# Altium schematic symbol library IC_ADI.SCHLIB: 3169 symbols (part 132 of 181)
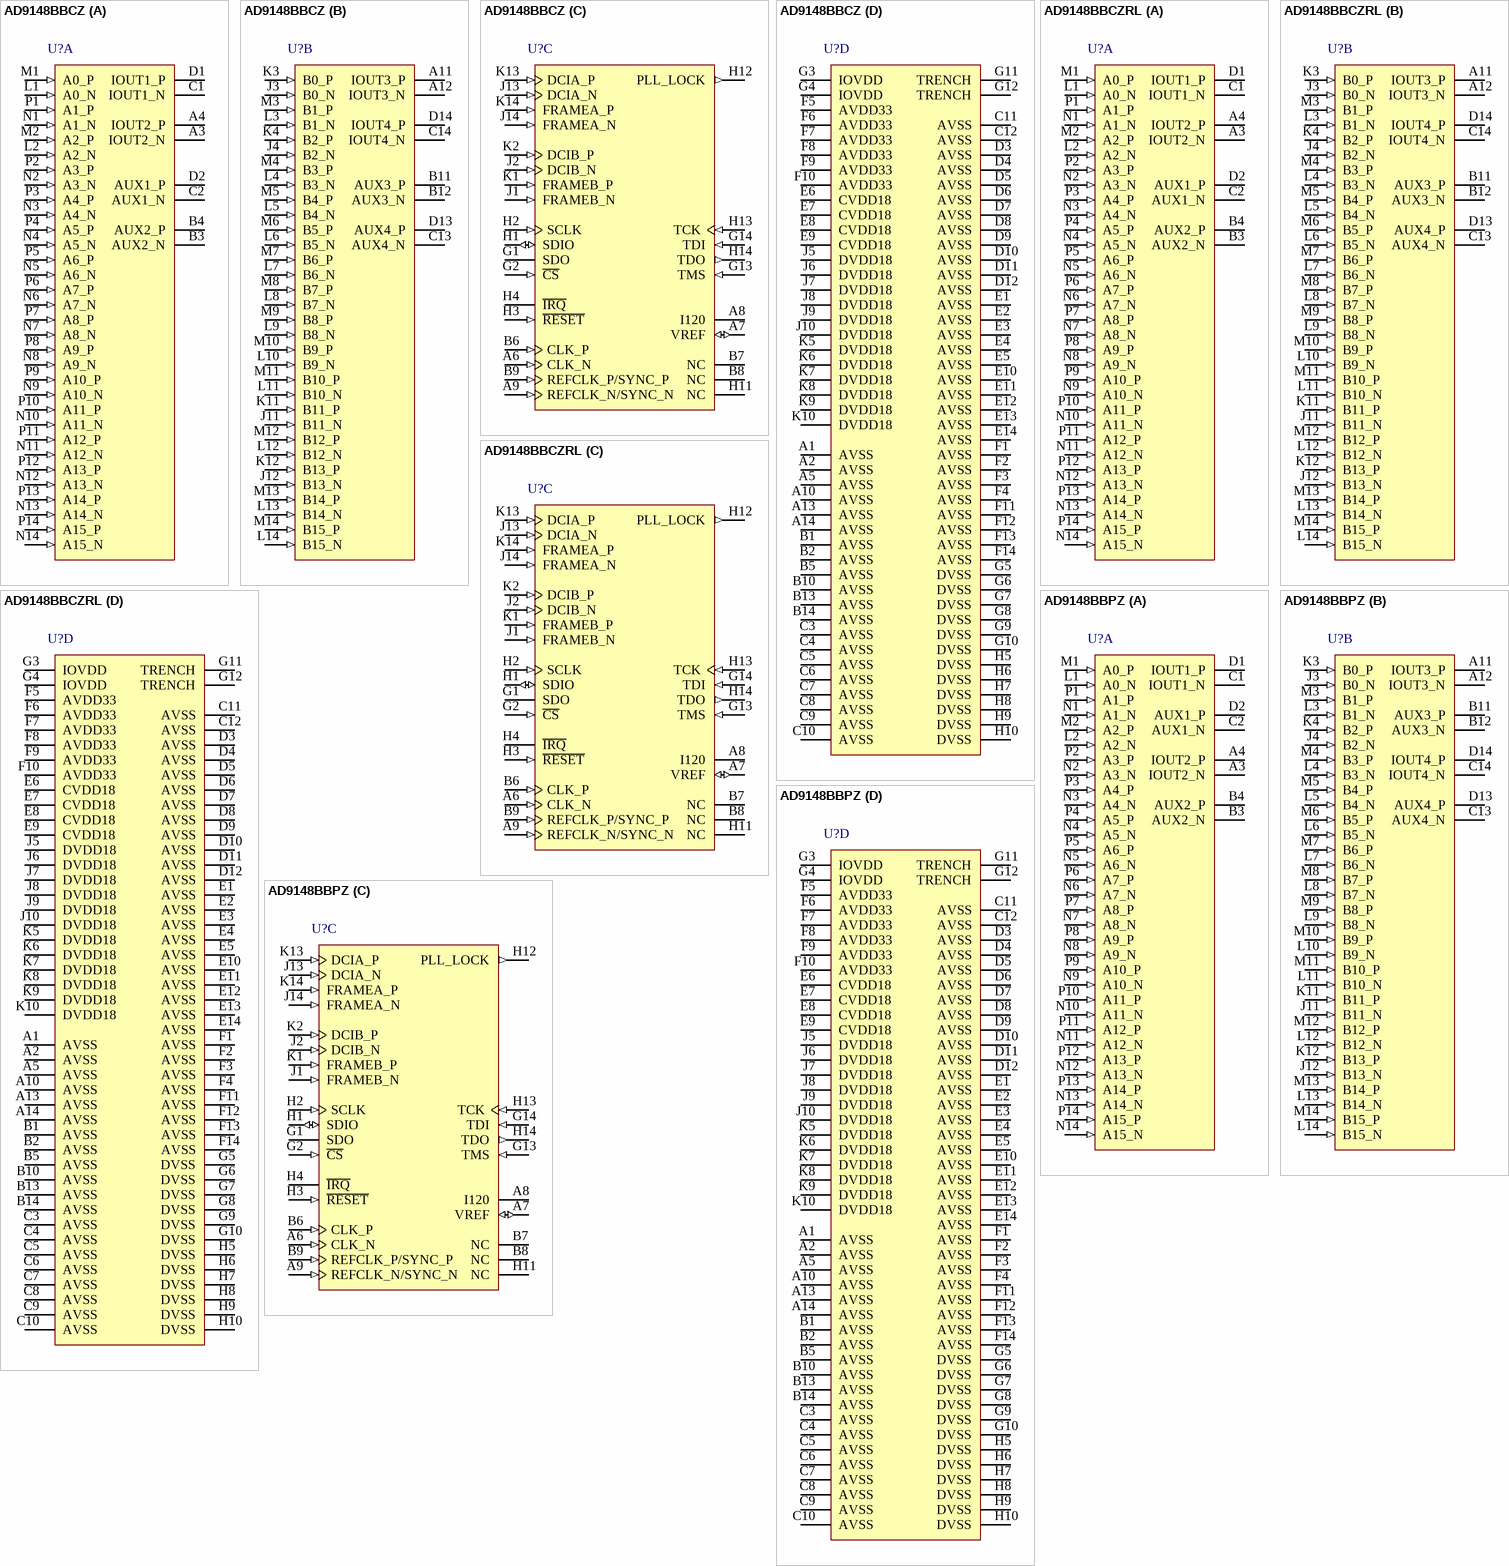
[diagram p322: symbols AD9148BBCZ to AD9148BBPZ]

## AD9148BBPZ
designator U?
Quad 16-Bit 1 Gsps TxDAC+ Digital-to-Analog Converter, -40 to +85 degC, BP-196-1, Pb-Free, Tray; Generic Part Number: AD9148; PartNumber: AD9148BBPZ; # DAC Outputs: 4; Max V+: 3.47V; Op Pwr Diss: 3W; Resolution (Bits): 16; Single Supply: No; DatasheetVersion: Rev.B; PackageVersion: 02-07-2012A; PackageReference: BP-196-1; PackageDescription: 196-Ball Ball Grid Array, Thermally Enhanced [BGA_ED]; Supplier Part Number 1: AD9148BBPZ-ND; Supplier Part Number 2: 83R9368; Supplier Part Number 3: 584-AD9148BBPZ; Packing: Tray; RoHS: Y; Mounting Technology: Surface Mount; Code_JEDEC: MO-192; ComponentLink1Description: Manufacturer URL; ComponentLink2Description: Datasheet; ComponentLink3Description: Product URL
footprint BGA196_0.8(12X12) (Footprint not found)
part A pins: A3 IOUT2_N (hiz) "DAC 2 Complementary Output Current.", A4 IOUT2_P (hiz) "DAC 2 Positive Output Current.", B3 AUX2_N (hiz) "Auxiliary DAC 2 Complementary Output Current.", B4 AUX2_P (hiz) "Auxiliary DAC 2 Positive Output Current.", C1 IOUT1_N (hiz) "DAC 1 Complementary Output Current.", C2 AUX1_N (hiz) "Auxiliary DAC 1 Complementary Output Current.", D1 IOUT1_P (hiz) "DAC 1 Positive Output Current.", D2 AUX1_P (hiz) "Auxiliary DAC 1 Positive Output Current.", L1 A0_N (in) "LVDS Data Input Pair, Port A (LSB).", L2 A2_N (in) "LVDS Data Input Pair, Port A.", M1 A0_P (in) "LVDS Data Input Pair, Port A (LSB).", M2 A2_P (in) "LVDS Data Input Pair, Port A.", N1 A1_N (in) "LVDS Data Input Pair, Port A.", N2 A3_N (in) "LVDS Data Input Pair, Port A.", N3 A4_N (in) "LVDS Data Input Pair, Port A.", N4 A5_N (in) "LVDS Data Input Pair, Port A.", N5 A6_N (in) "LVDS Data Input Pair, Port A.", N6 A7_N (in) "LVDS Data Input Pair, Port A.", N7 A8_N (in) "LVDS Data Input Pair, Port A.", N8 A9_N (in) "LVDS Data Input Pair, Port A.", N9 A10_N (in) "LVDS Data Input Pair, Port A.", N10 A11_N (in) "LVDS Data Input Pair, Port A.", N11 A12_N (in) "LVDS Data Input Pair, Port A.", N12 A13_N (in) "LVDS Data Input Pair, Port A.", N13 A14_N (in) "LVDS Data Input Pair, Port A.", N14 A15_N (in) "LVDS Data Input Pair, Port A (MSB).", P1 A1_P (in) "LVDS Data Input Pair, Port A.", P2 A3_P (in) "LVDS Data Input Pair, Port A.", P3 A4_P (in) "LVDS Data Input Pair, Port A.", P4 A5_P (in) "LVDS Data Input Pair, Port A.", P5 A6_P (in) "LVDS Data Input Pair, Port A.", P6 A7_P (in) "LVDS Data Input Pair, Port A.", P7 A8_P (in) "LVDS Data Input Pair, Port A.", P8 A9_P (in) "LVDS Data Input Pair, Port A.", P9 A10_P (in) "LVDS Data Input Pair, Port A.", P10 A11_P (in) "LVDS Data Input Pair, Port A.", P11 A12_P (in) "LVDS Data Input Pair, Port A.", P12 A13_P (in) "LVDS Data Input Pair, Port A.", P13 A14_P (in) "LVDS Data Input Pair, Port A.", P14 A15_P (in) "LVDS Data Input Pair, Port A (MSB)."
part B pins: A11 IOUT3_P (hiz) "DAC 3 Positive Output Current.", A12 IOUT3_N (hiz) "DAC 3 Complementary Output Current.", B11 AUX3_P (hiz) "Auxiliary DAC 3 Positive Output Current.", B12 AUX3_N (hiz) "Auxiliary DAC 3 Complementary Output Current.", C13 AUX4_N (hiz) "Auxiliary DAC 4 Complementary Output Current.", C14 IOUT4_N (hiz) "DAC 4 Complementary Output Current.", D13 AUX4_P (hiz) "Auxiliary DAC 4 Positive Output Current.", D14 IOUT4_P (hiz) "DAC 4 Positive Output Current.", J3 B0_N (in) "LVDS Data Input Pair, Port B (LSB).", J4 B2_N (in) "LVDS Data Input Pair, Port B.", J11 B11_N (in) "LVDS Data Input Pair, Port B.", J12 B13_N (in) "LVDS Data Input Pair, Port B.", K3 B0_P (in) "LVDS Data Input Pair, Port B (LSB).", K4 B2_P (in) "LVDS Data Input Pair, Port B.", K11 B11_P (in) "LVDS Data Input Pair, Port B.", K12 B13_P (in) "LVDS Data Input Pair, Port B.", L3 B1_N (in) "LVDS Data Input Pair, Port B.", L4 B3_N (in) "LVDS Data Input Pair, Port B.", L5 B4_N (in) "LVDS Data Input Pair, Port B.", L6 B5_N (in) "LVDS Data Input Pair, Port B.", L7 B6_N (in) "LVDS Data Input Pair, Port B.", L8 B7_N (in) "LVDS Data Input Pair, Port B.", L9 B8_N (in) "LVDS Data Input Pair, Port B.", L10 B9_N (in) "LVDS Data Input Pair, Port B.", L11 B10_N (in) "LVDS Data Input Pair, Port B.", L12 B12_N (in) "LVDS Data Input Pair, Port B.", L13 B14_N (in) "LVDS Data Input Pair, Port B.", L14 B15_N (in) "LVDS Data Input Pair, Port B (MSB).", M3 B1_P (in) "LVDS Data Input Pair, Port B.", M4 B3_P (in) "LVDS Data Input Pair, Port B.", M5 B4_P (in) "LVDS Data Input Pair, Port B.", M6 B5_P (in) "LVDS Data Input Pair, Port B.", M7 B6_P (in) "LVDS Data Input Pair, Port B.", M8 B7_P (in) "LVDS Data Input Pair, Port B.", M9 B8_P (in) "LVDS Data Input Pair, Port B.", M10 B9_P (in) "LVDS Data Input Pair, Port B.", M11 B10_P (in) "LVDS Data Input Pair, Port B.", M12 B12_P (in) "LVDS Data Input Pair, Port B.", M13 B14_P (in) "LVDS Data Input Pair, Port B.", M14 B15_P (in) "LVDS Data Input Pair, Port B (MSB)."
part C pins: A6 CLK_N (in) "Negative DAC Clock Input (CLK).", A7 VREF (io) "Band Gap Voltage Reference I/O. Decouple to analog ground via a 0.1 uF capacitor. Output impedance is approximately 5 kohm.", A8 I120 "Tie to analog ground via a 10 kohm resistor to generate a 120 uA reference current.", A9 REFCLK_N/SYNC_N (in) "PLL Reference Clock Input (REFCLK_N). This pin has a secondary function as a synchronization input (SYNC_N).", B6 CLK_P (in) "Positive DAC Clock Input (CLK).", B7 NC "No Connect. Do not connect to this pin.", B8 NC "No Connect. Do not connect to this pin.", B9 REFCLK_P/SYNC_P (in) "PLL Reference Clock Input (REFCLK_P). This pin has a secondary function as a synchronization input (SYNC_P).", G1 SDO (hiz) "Serial Data Output for SPI.", G2 ~{CS} (in) "Active Low Chip Select for SPI.", G13 TMS (in) "Reserved for Future Use. Connect to DVSS.", G14 TDI (in) "Reserved for Future Use. Connect to DVSS.", H1 SDIO (io) "Serial Data Input/Output for SPI.", H2 SCLK (in) "Qualifying Clock Input for SPI.", H3 ~{RESET} (in) "An active low LVCMOS input resets the device. Pull up to IOVDD.", H4 ~{IRQ} (oc) "Active Low Open-Drain Interrupt Request Output. Pull up to IOVDD with a 10 kohm resistor.", H11 NC "No Connect. Do not connect to this pin.", H12 PLL_LOCK (out) "Active High LVCMOS Output. It indicates the lock status of the PLL circuitry.", H13 TCK (in) "Reserved for Future Use. Connect to DVSS.", H14 TDO (out) "Reserved for Future Use. Leave unconnected.", J1 FRAMEB_N (in) "LVDS Frame Input for Port B. Tie to LVDS logic low if not used. Recommended external bias circuit is shown in Figure 49.", J2 DCIB_N (in) "LVDS Data Clock Input Pair for Port B.", J13 DCIA_N (in) "LVDS Data Clock Input Pair for Port A.", J14 FRAMEA_N (in) "LVDS Frame Input for Port A. Tie to LVDS logic low if not used. Recommended external bias circuit is shown in Figure 49.", K1 FRAMEB_P (in) "LVDS Frame Input for Port B. Tie to LVDS logic low if not used. Recommended external bias circuit is shown in Figure 49.", K2 DCIB_P (in) "LVDS Data Clock Input Pair for Port B.", K13 DCIA_P (in) "LVDS Data Clock Input Pair for Port A.", K14 FRAMEA_P (in) "LVDS Frame Input for Port A. Tie to LVDS logic low if not used. Recommended external bias circuit is shown in Figure 49."
part D pins: A1 AVSS (power) "Analog Supply Ground.", A2 AVSS (power) "Analog Supply Ground.", A5 AVSS (power) "Analog Supply Ground.", A10 AVSS (power) "Analog Supply Ground.", A13 AVSS (power) "Analog Supply Ground.", A14 AVSS (power) "Analog Supply Ground.", B1 AVSS (power) "Analog Supply Ground.", B2 AVSS (power) "Analog Supply Ground.", B5 AVSS (power) "Analog Supply Ground.", B10 AVSS (power) "Analog Supply Ground.", B13 AVSS (power) "Analog Supply Ground.", B14 AVSS (power) "Analog Supply Ground.", C3 AVSS (power) "Analog Supply Ground.", C4 AVSS (power) "Analog Supply Ground.", C5 AVSS (power) "Analog Supply Ground.", C6 AVSS (power) "Analog Supply Ground.", C7 AVSS (power) "Analog Supply Ground.", C8 AVSS (power) "Analog Supply Ground.", C9 AVSS (power) "Analog Supply Ground.", C10 AVSS (power) "Analog Supply Ground.", C11 AVSS (power) "Analog Supply Ground.", C12 AVSS (power) "Analog Supply Ground.", D3 AVSS (power) "Analog Supply Ground.", D4 AVSS (power) "Analog Supply Ground.", D5 AVSS (power) "Analog Supply Ground.", D6 AVSS (power) "Analog Supply Ground.", D7 AVSS (power) "Analog Supply Ground.", D8 AVSS (power) "Analog Supply Ground.", D9 AVSS (power) "Analog Supply Ground.", D10 AVSS (power) "Analog Supply Ground.", D11 AVSS (power) "Analog Supply Ground.", D12 AVSS (power) "Analog Supply Ground.", E1 AVSS (power) "Analog Supply Ground.", E2 AVSS (power) "Analog Supply Ground.", E3 AVSS (power) "Analog Supply Ground.", E4 AVSS (power) "Analog Supply Ground.", E5 AVSS (power) "Analog Supply Ground.", E6 CVDD18 (power) "1.8 V Clock Supply.", E7 CVDD18 (power) "1.8 V Clock Supply.", E8 CVDD18 (power) "1.8 V Clock Supply.", E9 CVDD18 (power) "1.8 V Clock Supply.", E10 AVSS (power) "Analog Supply Ground.", E11 AVSS (power) "Analog Supply Ground.", E12 AVSS (power) "Analog Supply Ground.", E13 AVSS (power) "Analog Supply Ground.", E14 AVSS (power) "Analog Supply Ground.", F1 AVSS (power) "Analog Supply Ground.", F2 AVSS (power) "Analog Supply Ground.", F3 AVSS (power) "Analog Supply Ground.", F4 AVSS (power) "Analog Supply Ground.", F5 AVDD33 (power) "3.3 V Analog Supply.", F6 AVDD33 (power) "3.3 V Analog Supply.", F7 AVDD33 (power) "3.3 V Analog Supply.", F8 AVDD33 (power) "3.3 V Analog Supply.", F9 AVDD33 (power) "3.3 V Analog Supply.", F10 AVDD33 (power) "3.3 V Analog Supply.", F11 AVSS (power) "Analog Supply Ground.", F12 AVSS (power) "Analog Supply Ground.", F13 AVSS (power) "Analog Supply Ground.", F14 AVSS (power) "Analog Supply Ground.", G3 IOVDD (power) "Supply for Serial Ports (SPI and TAP), R\E\S\E\T\ and I\R\Q\. 1.8 V to 3.3 V can be supplied to these pins.", G4 IOVDD (power) "Supply for Serial Ports (SPI and TAP), R\E\S\E\T\ and I\R\Q\. 1.8 V to 3.3 V can be supplied to these pins.", G5 DVSS (power) "Digital Supply Ground.", G6 DVSS (power) "Digital Supply Ground.", G7 DVSS (power) "Digital Supply Ground.", G8 DVSS (power) "Digital Supply Ground.", G9 DVSS (power) "Digital Supply Ground.", G10 DVSS (power) "Digital Supply Ground.", G11 TRENCH (power) "Connect this pin to VSS.", G12 TRENCH (power) "Connect this pin to VSS.", H5 DVSS (power) "Digital Supply Ground.", H6 DVSS (power) "Digital Supply Ground.", H7 DVSS (power) "Digital Supply Ground.", H8 DVSS (power) "Digital Supply Ground.", H9 DVSS (power) "Digital Supply Ground.", H10 DVSS (power) "Digital Supply Ground.", J5 DVDD18 (power) "1.8 V Digital Supply.", J6 DVDD18 (power) "1.8 V Digital Supply.", J7 DVDD18 (power) "1.8 V Digital Supply.", J8 DVDD18 (power) "1.8 V Digital Supply.", J9 DVDD18 (power) "1.8 V Digital Supply.", J10 DVDD18 (power) "1.8 V Digital Supply.", K5 DVDD18 (power) "1.8 V Digital Supply.", K6 DVDD18 (power) "1.8 V Digital Supply.", K7 DVDD18 (power) "1.8 V Digital Supply.", K8 DVDD18 (power) "1.8 V Digital Supply.", K9 DVDD18 (power) "1.8 V Digital Supply.", K10 DVDD18 (power) "1.8 V Digital Supply."

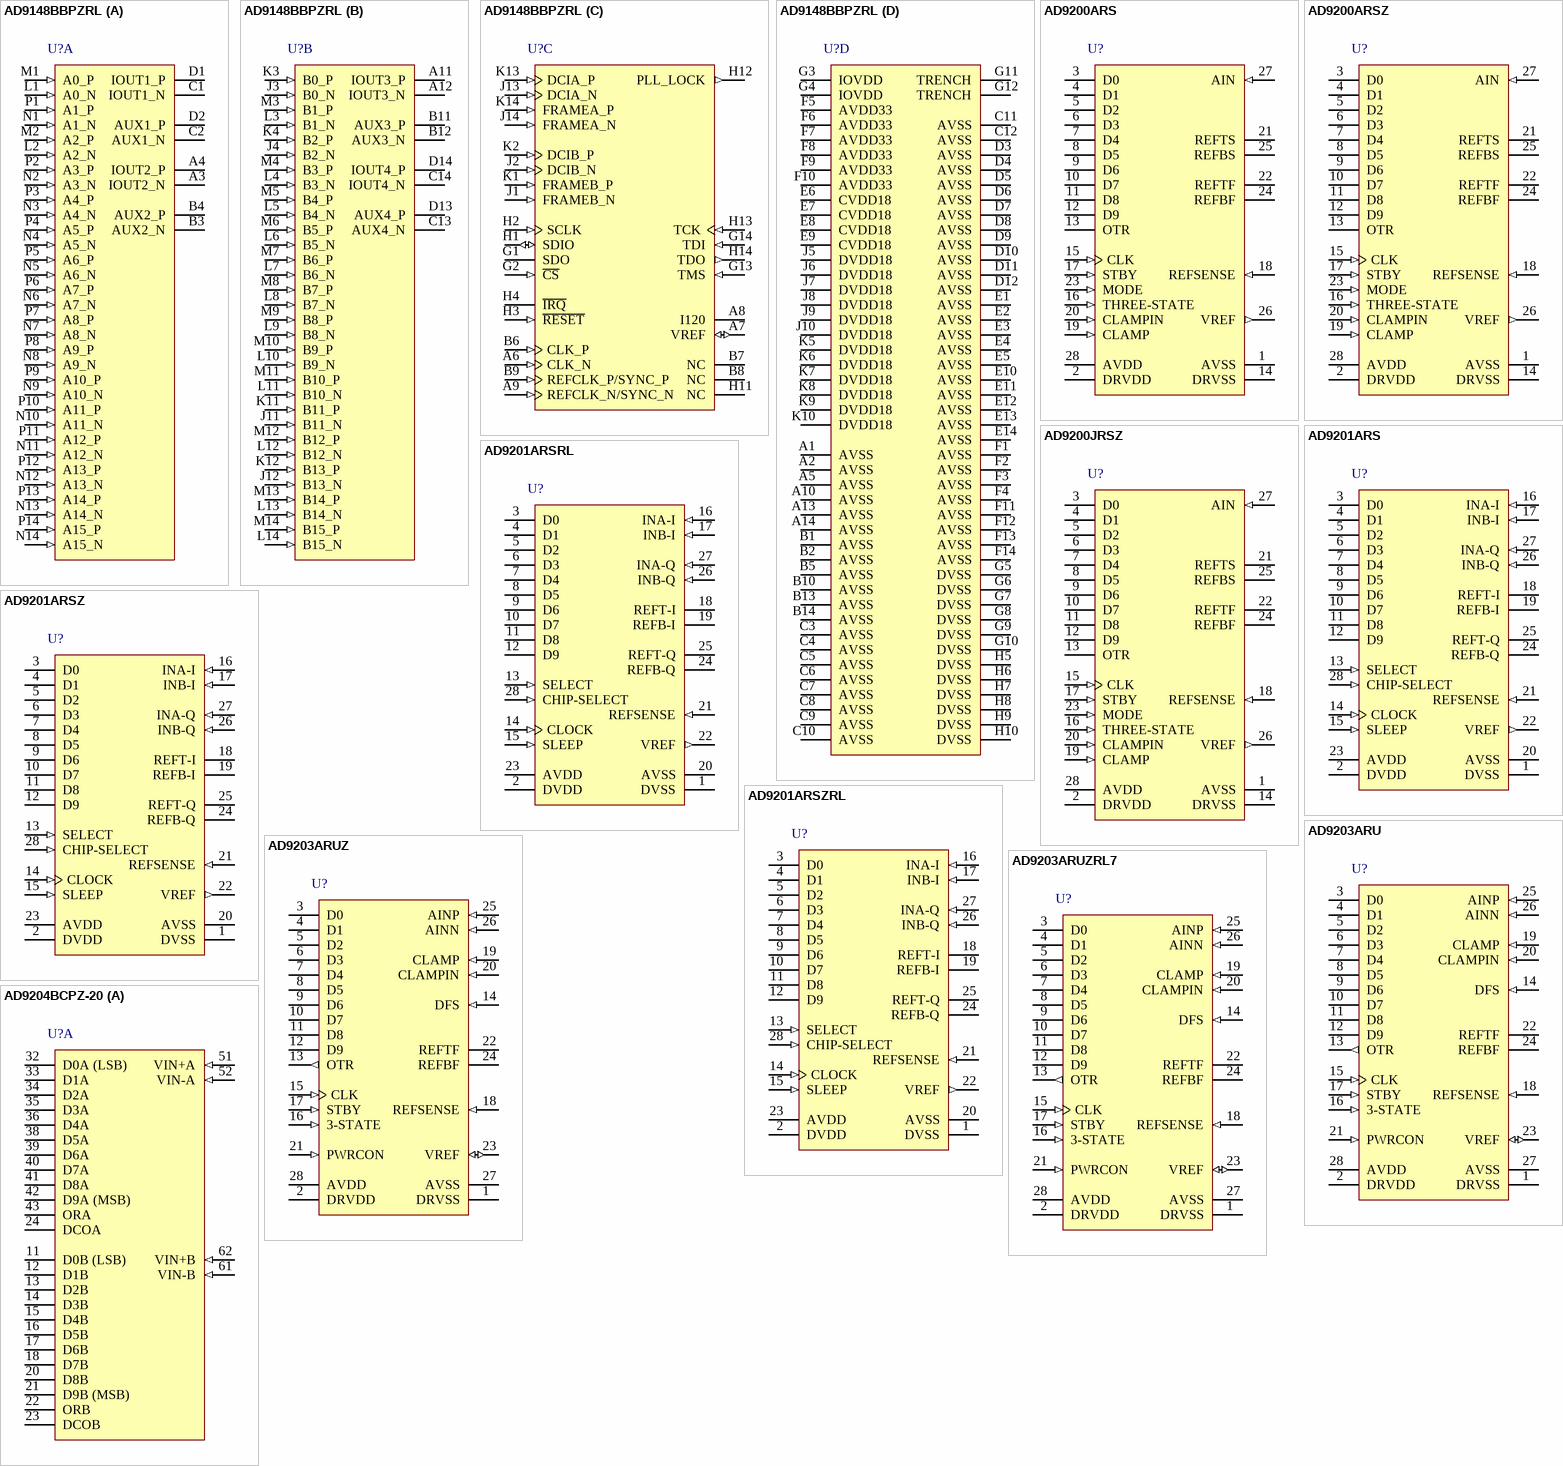
[diagram p103: symbols AD9148BBPZRL to AD9204BCPZ-20]

## AD9148BBPZRL
designator U?
Quad 16-Bit 1 Gsps TxDAC+ Digital-to-Analog Converter, -40 to +85 degC, BP-196-1, Pb-Free, Reel; Generic Part Number: AD9148; PartNumber: AD9148BBPZRL; # DAC Outputs: 4; Max V+: 3.47V; Op Pwr Diss: 3W; Resolution (Bits): 16; Single Supply: No; DatasheetVersion: Rev.B; PackageVersion: 02-07-2012A; PackageReference: BP-196-1; PackageDescription: 196-Ball Ball Grid Array, Thermally Enhanced [BGA_ED]; Supplier Part Number 1: AD9148BBPZRL-ND; Supplier Part Number 2: 584-AD9148BBPZR; Packing: Reel; RoHS: Y; Mounting Technology: Surface Mount; Code_JEDEC: MO-192; ComponentLink1Description: Manufacturer URL; ComponentLink2Description: Datasheet; ComponentLink3Description: Product URL
footprint BGA196_0.8(12X12) (Footprint not found)
part A pins: A3 IOUT2_N (hiz) "DAC 2 Complementary Output Current.", A4 IOUT2_P (hiz) "DAC 2 Positive Output Current.", B3 AUX2_N (hiz) "Auxiliary DAC 2 Complementary Output Current.", B4 AUX2_P (hiz) "Auxiliary DAC 2 Positive Output Current.", C1 IOUT1_N (hiz) "DAC 1 Complementary Output Current.", C2 AUX1_N (hiz) "Auxiliary DAC 1 Complementary Output Current.", D1 IOUT1_P (hiz) "DAC 1 Positive Output Current.", D2 AUX1_P (hiz) "Auxiliary DAC 1 Positive Output Current.", L1 A0_N (in) "LVDS Data Input Pair, Port A (LSB).", L2 A2_N (in) "LVDS Data Input Pair, Port A.", M1 A0_P (in) "LVDS Data Input Pair, Port A (LSB).", M2 A2_P (in) "LVDS Data Input Pair, Port A.", N1 A1_N (in) "LVDS Data Input Pair, Port A.", N2 A3_N (in) "LVDS Data Input Pair, Port A.", N3 A4_N (in) "LVDS Data Input Pair, Port A.", N4 A5_N (in) "LVDS Data Input Pair, Port A.", N5 A6_N (in) "LVDS Data Input Pair, Port A.", N6 A7_N (in) "LVDS Data Input Pair, Port A.", N7 A8_N (in) "LVDS Data Input Pair, Port A.", N8 A9_N (in) "LVDS Data Input Pair, Port A.", N9 A10_N (in) "LVDS Data Input Pair, Port A.", N10 A11_N (in) "LVDS Data Input Pair, Port A.", N11 A12_N (in) "LVDS Data Input Pair, Port A.", N12 A13_N (in) "LVDS Data Input Pair, Port A.", N13 A14_N (in) "LVDS Data Input Pair, Port A.", N14 A15_N (in) "LVDS Data Input Pair, Port A (MSB).", P1 A1_P (in) "LVDS Data Input Pair, Port A.", P2 A3_P (in) "LVDS Data Input Pair, Port A.", P3 A4_P (in) "LVDS Data Input Pair, Port A.", P4 A5_P (in) "LVDS Data Input Pair, Port A.", P5 A6_P (in) "LVDS Data Input Pair, Port A.", P6 A7_P (in) "LVDS Data Input Pair, Port A.", P7 A8_P (in) "LVDS Data Input Pair, Port A.", P8 A9_P (in) "LVDS Data Input Pair, Port A.", P9 A10_P (in) "LVDS Data Input Pair, Port A.", P10 A11_P (in) "LVDS Data Input Pair, Port A.", P11 A12_P (in) "LVDS Data Input Pair, Port A.", P12 A13_P (in) "LVDS Data Input Pair, Port A.", P13 A14_P (in) "LVDS Data Input Pair, Port A.", P14 A15_P (in) "LVDS Data Input Pair, Port A (MSB)."
part B pins: A11 IOUT3_P (hiz) "DAC 3 Positive Output Current.", A12 IOUT3_N (hiz) "DAC 3 Complementary Output Current.", B11 AUX3_P (hiz) "Auxiliary DAC 3 Positive Output Current.", B12 AUX3_N (hiz) "Auxiliary DAC 3 Complementary Output Current.", C13 AUX4_N (hiz) "Auxiliary DAC 4 Complementary Output Current.", C14 IOUT4_N (hiz) "DAC 4 Complementary Output Current.", D13 AUX4_P (hiz) "Auxiliary DAC 4 Positive Output Current.", D14 IOUT4_P (hiz) "DAC 4 Positive Output Current.", J3 B0_N (in) "LVDS Data Input Pair, Port B (LSB).", J4 B2_N (in) "LVDS Data Input Pair, Port B.", J11 B11_N (in) "LVDS Data Input Pair, Port B.", J12 B13_N (in) "LVDS Data Input Pair, Port B.", K3 B0_P (in) "LVDS Data Input Pair, Port B (LSB).", K4 B2_P (in) "LVDS Data Input Pair, Port B.", K11 B11_P (in) "LVDS Data Input Pair, Port B.", K12 B13_P (in) "LVDS Data Input Pair, Port B.", L3 B1_N (in) "LVDS Data Input Pair, Port B.", L4 B3_N (in) "LVDS Data Input Pair, Port B.", L5 B4_N (in) "LVDS Data Input Pair, Port B.", L6 B5_N (in) "LVDS Data Input Pair, Port B.", L7 B6_N (in) "LVDS Data Input Pair, Port B.", L8 B7_N (in) "LVDS Data Input Pair, Port B.", L9 B8_N (in) "LVDS Data Input Pair, Port B.", L10 B9_N (in) "LVDS Data Input Pair, Port B.", L11 B10_N (in) "LVDS Data Input Pair, Port B.", L12 B12_N (in) "LVDS Data Input Pair, Port B.", L13 B14_N (in) "LVDS Data Input Pair, Port B.", L14 B15_N (in) "LVDS Data Input Pair, Port B (MSB).", M3 B1_P (in) "LVDS Data Input Pair, Port B.", M4 B3_P (in) "LVDS Data Input Pair, Port B.", M5 B4_P (in) "LVDS Data Input Pair, Port B.", M6 B5_P (in) "LVDS Data Input Pair, Port B.", M7 B6_P (in) "LVDS Data Input Pair, Port B.", M8 B7_P (in) "LVDS Data Input Pair, Port B.", M9 B8_P (in) "LVDS Data Input Pair, Port B.", M10 B9_P (in) "LVDS Data Input Pair, Port B.", M11 B10_P (in) "LVDS Data Input Pair, Port B.", M12 B12_P (in) "LVDS Data Input Pair, Port B.", M13 B14_P (in) "LVDS Data Input Pair, Port B.", M14 B15_P (in) "LVDS Data Input Pair, Port B (MSB)."
part C pins: A6 CLK_N (in) "Negative DAC Clock Input (CLK).", A7 VREF (io) "Band Gap Voltage Reference I/O. Decouple to analog ground via a 0.1 uF capacitor. Output impedance is approximately 5 kohm.", A8 I120 "Tie to analog ground via a 10 kohm resistor to generate a 120 uA reference current.", A9 REFCLK_N/SYNC_N (in) "PLL Reference Clock Input (REFCLK_N). This pin has a secondary function as a synchronization input (SYNC_N).", B6 CLK_P (in) "Positive DAC Clock Input (CLK).", B7 NC "No Connect. Do not connect to this pin.", B8 NC "No Connect. Do not connect to this pin.", B9 REFCLK_P/SYNC_P (in) "PLL Reference Clock Input (REFCLK_P). This pin has a secondary function as a synchronization input (SYNC_P).", G1 SDO (hiz) "Serial Data Output for SPI.", G2 ~{CS} (in) "Active Low Chip Select for SPI.", G13 TMS (in) "Reserved for Future Use. Connect to DVSS.", G14 TDI (in) "Reserved for Future Use. Connect to DVSS.", H1 SDIO (io) "Serial Data Input/Output for SPI.", H2 SCLK (in) "Qualifying Clock Input for SPI.", H3 ~{RESET} (in) "An active low LVCMOS input resets the device. Pull up to IOVDD.", H4 ~{IRQ} (oc) "Active Low Open-Drain Interrupt Request Output. Pull up to IOVDD with a 10 kohm resistor.", H11 NC "No Connect. Do not connect to this pin.", H12 PLL_LOCK (out) "Active High LVCMOS Output. It indicates the lock status of the PLL circuitry.", H13 TCK (in) "Reserved for Future Use. Connect to DVSS.", H14 TDO (out) "Reserved for Future Use. Leave unconnected.", J1 FRAMEB_N (in) "LVDS Frame Input for Port B. Tie to LVDS logic low if not used. Recommended external bias circuit is shown in Figure 49.", J2 DCIB_N (in) "LVDS Data Clock Input Pair for Port B.", J13 DCIA_N (in) "LVDS Data Clock Input Pair for Port A.", J14 FRAMEA_N (in) "LVDS Frame Input for Port A. Tie to LVDS logic low if not used. Recommended external bias circuit is shown in Figure 49.", K1 FRAMEB_P (in) "LVDS Frame Input for Port B. Tie to LVDS logic low if not used. Recommended external bias circuit is shown in Figure 49.", K2 DCIB_P (in) "LVDS Data Clock Input Pair for Port B.", K13 DCIA_P (in) "LVDS Data Clock Input Pair for Port A.", K14 FRAMEA_P (in) "LVDS Frame Input for Port A. Tie to LVDS logic low if not used. Recommended external bias circuit is shown in Figure 49."
part D pins: A1 AVSS (power) "Analog Supply Ground.", A2 AVSS (power) "Analog Supply Ground.", A5 AVSS (power) "Analog Supply Ground.", A10 AVSS (power) "Analog Supply Ground.", A13 AVSS (power) "Analog Supply Ground.", A14 AVSS (power) "Analog Supply Ground.", B1 AVSS (power) "Analog Supply Ground.", B2 AVSS (power) "Analog Supply Ground.", B5 AVSS (power) "Analog Supply Ground.", B10 AVSS (power) "Analog Supply Ground.", B13 AVSS (power) "Analog Supply Ground.", B14 AVSS (power) "Analog Supply Ground.", C3 AVSS (power) "Analog Supply Ground.", C4 AVSS (power) "Analog Supply Ground.", C5 AVSS (power) "Analog Supply Ground.", C6 AVSS (power) "Analog Supply Ground.", C7 AVSS (power) "Analog Supply Ground.", C8 AVSS (power) "Analog Supply Ground.", C9 AVSS (power) "Analog Supply Ground.", C10 AVSS (power) "Analog Supply Ground.", C11 AVSS (power) "Analog Supply Ground.", C12 AVSS (power) "Analog Supply Ground.", D3 AVSS (power) "Analog Supply Ground.", D4 AVSS (power) "Analog Supply Ground.", D5 AVSS (power) "Analog Supply Ground.", D6 AVSS (power) "Analog Supply Ground.", D7 AVSS (power) "Analog Supply Ground.", D8 AVSS (power) "Analog Supply Ground.", D9 AVSS (power) "Analog Supply Ground.", D10 AVSS (power) "Analog Supply Ground.", D11 AVSS (power) "Analog Supply Ground.", D12 AVSS (power) "Analog Supply Ground.", E1 AVSS (power) "Analog Supply Ground.", E2 AVSS (power) "Analog Supply Ground.", E3 AVSS (power) "Analog Supply Ground.", E4 AVSS (power) "Analog Supply Ground.", E5 AVSS (power) "Analog Supply Ground.", E6 CVDD18 (power) "1.8 V Clock Supply.", E7 CVDD18 (power) "1.8 V Clock Supply.", E8 CVDD18 (power) "1.8 V Clock Supply.", E9 CVDD18 (power) "1.8 V Clock Supply.", E10 AVSS (power) "Analog Supply Ground.", E11 AVSS (power) "Analog Supply Ground.", E12 AVSS (power) "Analog Supply Ground.", E13 AVSS (power) "Analog Supply Ground.", E14 AVSS (power) "Analog Supply Ground.", F1 AVSS (power) "Analog Supply Ground.", F2 AVSS (power) "Analog Supply Ground.", F3 AVSS (power) "Analog Supply Ground.", F4 AVSS (power) "Analog Supply Ground.", F5 AVDD33 (power) "3.3 V Analog Supply.", F6 AVDD33 (power) "3.3 V Analog Supply.", F7 AVDD33 (power) "3.3 V Analog Supply.", F8 AVDD33 (power) "3.3 V Analog Supply.", F9 AVDD33 (power) "3.3 V Analog Supply.", F10 AVDD33 (power) "3.3 V Analog Supply.", F11 AVSS (power) "Analog Supply Ground.", F12 AVSS (power) "Analog Supply Ground.", F13 AVSS (power) "Analog Supply Ground.", F14 AVSS (power) "Analog Supply Ground.", G3 IOVDD (power) "Supply for Serial Ports (SPI and TAP), R\E\S\E\T\ and I\R\Q\. 1.8 V to 3.3 V can be supplied to these pins.", G4 IOVDD (power) "Supply for Serial Ports (SPI and TAP), R\E\S\E\T\ and I\R\Q\. 1.8 V to 3.3 V can be supplied to these pins.", G5 DVSS (power) "Digital Supply Ground.", G6 DVSS (power) "Digital Supply Ground.", G7 DVSS (power) "Digital Supply Ground.", G8 DVSS (power) "Digital Supply Ground.", G9 DVSS (power) "Digital Supply Ground.", G10 DVSS (power) "Digital Supply Ground.", G11 TRENCH (power) "Connect this pin to VSS.", G12 TRENCH (power) "Connect this pin to VSS.", H5 DVSS (power) "Digital Supply Ground.", H6 DVSS (power) "Digital Supply Ground.", H7 DVSS (power) "Digital Supply Ground.", H8 DVSS (power) "Digital Supply Ground.", H9 DVSS (power) "Digital Supply Ground.", H10 DVSS (power) "Digital Supply Ground.", J5 DVDD18 (power) "1.8 V Digital Supply.", J6 DVDD18 (power) "1.8 V Digital Supply.", J7 DVDD18 (power) "1.8 V Digital Supply.", J8 DVDD18 (power) "1.8 V Digital Supply.", J9 DVDD18 (power) "1.8 V Digital Supply.", J10 DVDD18 (power) "1.8 V Digital Supply.", K5 DVDD18 (power) "1.8 V Digital Supply.", K6 DVDD18 (power) "1.8 V Digital Supply.", K7 DVDD18 (power) "1.8 V Digital Supply.", K8 DVDD18 (power) "1.8 V Digital Supply.", K9 DVDD18 (power) "1.8 V Digital Supply.", K10 DVDD18 (power) "1.8 V Digital Supply."